# Altium footprint library Item_pcb.PcbLib: 282 footprints (part 18 of 18)
Each footprint in its own frame and in the unit in brackets; x right, y up, seen from the top. Pads: shape width x height; smd on the part's side, far side on the other; paste and mask are expansions set on the pad; w line width, h text height; cw(c..) or ccw(c..) is an arc to the next point about the centre after c.
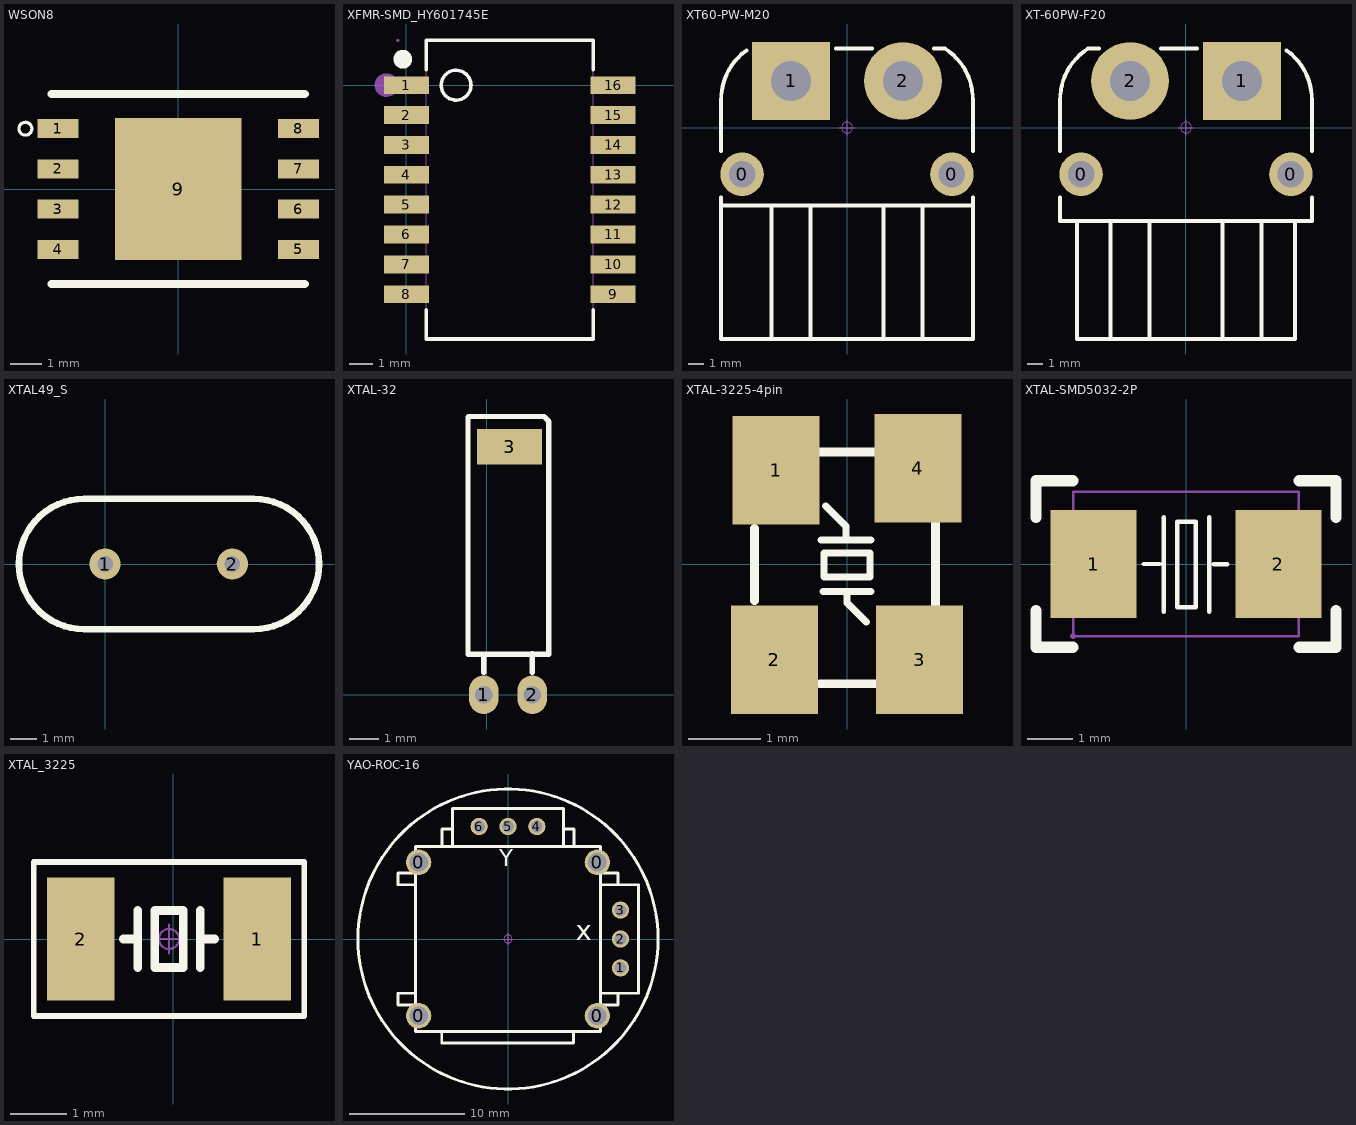
[diagram p17: the footprints below, top view; thin cyan lines are the x and y axes]

## WSON8 [mm]
pads (9):
  rect 1.3x0.6 smd: 1(-3.8,1.905) 2(-3.8,0.635) 3(-3.8,-0.635) 4(-3.8,-1.905) 5(3.8,-1.905) 6(3.8,-0.635) 7(3.8,0.635) 8(3.8,1.905)
  rect 4x4.5 smd: 9(0,0)
Top Overlay:
  circle w0.1: c-4.826,1.905 r0.203
  lines w0.254: -4,-3 4,-3 ; -4,3 4,3
3D body "User Library-WSON-8_6x8mm.STEP": height 0.81, standoff -0.07, extent -4.039,-3 3.961,3

## XFMR-SMD_HY601745E [mm]
pads (16):
  rect 1.905x0.76 smd: 1(0,0) 2(0,-1.27) 3(0,-2.54) 4(0,-3.81) 5(0,-5.08) 6(0,-6.35) 7(0,-7.62) 8(0,-8.89) 9(8.788,-8.89) 10(8.788,-7.62) 11(8.788,-6.35) 12(8.788,-5.08) 13(8.788,-3.81) 14(8.788,-2.54) 15(8.788,-1.27) 16(8.788,0)
Top Overlay:
  circle w0.15: c2.108,0 r0.635
  circle w0.4: c-0.156,1.105 r0.2
  lines w0.15: 0.839,-9.545 0.839,-10.795 7.949,-10.795 7.949,-9.545 ; 0.839,0.655 0.839,1.905 7.949,1.905 7.949,0.655
Mechanical 6:
  circle w0.5: c-0.856,0.005 r0.25
Mechanical 15:
  drawing of 37 lines, arcs and shapes, not listed
3D body "3D_PCB2_2024-03-27-HY_end.STEP": height 5.8, standoff 0.1, extent -0.356,-10.795 9.144,1.905

## XT60-PW-M20 [mm] "长：18.8mm， 宽：16mm，高：8.6mm"
pads (4):
  round 2.8 hole 1.7: 0(-6.75,-3) 0(6.75,-3)
  rect 5x5 hole 2.6: 1(-3.6,3)
  round 5 hole 2.6: 2(3.6,3)
Top Overlay:
  lines w0.254: -8.1,-4.5 -8.1,-5 ; -8.1,-1.5 -8.1,1.792 ; -8.1,1.738 cw(c-4.2,1.8) -6.476,4.967 ; -4.85,-13.6 -4.85,-5 ; -2.35,-13.6 -2.35,-5 ; -0.7,5.1 1.6,5.1 ; 2.35,-13.6 2.35,-5 ; 4.85,-13.6 4.85,-5 ; 5.6,5.1 6.294,5.1 ; 6.294,5.091 cw(c4.2,1.8) 8.1,1.738 8.1,-1.5 ; 8.1,-4.5 8.1,-5 ; -8.1,-5 -8.1,-13.6 8.1,-13.6 8.1,-5 ; -8.1,-5 8.1,-5
Mechanical 15:
  circle w0.05: c0,0 r0.35
  lines w0.05: -0.5,0 0.5,0 ; 0,-0.5 0,0.5
3D body "3D_xt60-PCB2_2021-12-22.step": height 9.7, standoff -1.4, extent -7.75,-14.97 7.75,5.029

## XT-60PW-F20 [mm]
pads (4):
  round 2.8 hole 1.7: 0(-6.75,-3) 0(6.75,-3)
  rect 5x5 hole 2.6: 1(3.6,3)
  round 5 hole 2.6: 2(-3.6,3)
Top Overlay:
  lines w0.254: -8.1,-4.5 -8.1,-6 8.1,-6 8.1,-4.5 ; -8.1,-1.5 -8.1,1.738 cw(c-4.2,1.8) -6.294,5.091 ; -7,-6 -7,-13.6 7,-13.6 7,-6 ; -6.294,5.1 -5.6,5.1 ; -4.85,-13.6 -4.85,-6 ; -2.35,-13.6 -2.35,-6 ; -1.6,5.1 0.7,5.1 ; 2.35,-13.6 2.35,-6 ; 4.85,-13.6 4.85,-6 ; 6.477,4.967 cw(c4.2,1.8) 8.1,1.738 ; 8.1,-1.5 8.1,1.792 ; 0,-6 ccw(c0,-6) 0,-6
Mechanical 15:
  circle w0.05: c0,0 r0.35
  lines w0.05: -0.5,0 0.5,0 ; 0,-0.5 0,0.5
3D body "TX60PW-F20.STEP": height 8.65, standoff -2.35, extent -8,-13.6 8,5.02

## XTAL49_S [mm]
pads (2):
  round 1.2 hole 0.6: 1(0,0) 2(4.88,0)
Top Overlay:
  lines w0.254: -3.3,0 ccw(c-0.8,0) -0.8,-2.5 5.7,-2.5 ccw(c5.7,0) 8.2,0 ccw(c5.7,0) 5.7,2.5 -0.8,2.5 ccw(c-0.8,0) -3.3,0
Mechanical 13:
  lines w0.025: -3.3,0 cw(c-0.8,0) -0.8,2.5 5.7,2.5 cw(c5.7,0) 8.2,0 cw(c5.7,0) 5.7,-2.5 -0.8,-2.5 cw(c-0.8,0) -3.3,0
3D body "SW3dPS-HP49US.STEP": height 4, standoff -3.5, extent -3.225,-2.32 8.125,2.33

## XTAL-32 [mm]
pads (3):
  oval 1x1.3 hole 0.6: 1(-0.1,0) 2(1.54,0)
  rect 2.2x1.2 smd: 3(0.775,8.382)
Top Overlay:
  lines w0.178: -0.1,0.762 -0.1,1.37 ; 1.54,0.762 1.54,1.386 ; -0.63,1.37 2.1,1.37 2.1,8.77 2.1,9.23 1.932,9.398 -0.608,9.398 -0.63,9.376 -0.63,8.77 -0.63,1.37
3D body "XTAL D2X6.STEP": height 2, standoff -1, extent -0.289,-0.229 1.711,7.471

## XTAL-3225-4pin [mm]
pads (4):
  rect 1.2x1.5 smd: 1(-0.978,1.295) 2(-1.003,-1.321) 3(1.003,-1.321) 4(0.978,1.321)
Top Overlay:
  lines w0.1: -0.356,0.33 0.33,0.33 ; -0.33,-0.381 0.33,-0.381 ; -0.292,0.8 -0.013,0.521 -0.013,0.33 ; 0,-0.381 0,-0.533 0.267,-0.8 ; -0.318,-0.178 -0.318,0.152 0.318,0.152 0.318,-0.178 -0.318,-0.178
  lines w0.12: -1.278,-0.505 -1.278,0.495 ; -0.378,-1.655 0.422,-1.655 ; -0.378,1.545 0.422,1.545 ; 1.222,-0.605 1.222,0.595
3D body "XTAL-3225.STEP": height 0.8, standoff 0, extent -1.268,-1.651 1.232,1.549

## XTAL-SMD5032-2P [mil]
pads (2):
  rect 74.8x94.5 smd mask+2: 1(-80.7,0) 2(80.7,0)
Top Overlay:
  lines w3.9: -37,0 -23,0 ; -19.25,-41.75 -19.25,40.95 ; 20.15,-41.75 20.15,40.95 ; 24.3,-0.4 36.1,-0.4 ; -7.45,-37.75 8.35,-37.75 8.35,37.05 -7.45,37.05 -7.45,-37.75
  lines w10: -130.9,-40.78 -130.9,-72.8 -98.88,-72.8 ; -130.9,40.78 -130.9,72.8 -98.88,72.8 ; 98.88,-72.8 130.9,-72.8 130.9,-40.78 ; 98.88,72.8 130.9,72.8 130.9,40.78
Mechanical 15:
  region: -47.2,39.4 -47.2,-39.4 -98.4,-39.4 -98.4,39.4
  region: 98.4,39.4 98.4,-39.4 47.2,-39.4 47.2,39.4
  region: -96,-63 -96,-62.01 -97.41,-60.6 -99.39,-60.6 -100.8,-62.01 -100.8,-63 -100.8,-63.99 -99.39,-65.4 -97.41,-65.4 -96,-63.99
  lines w2: -98.4,-63 98.4,-63 98.4,63 -98.4,63 -98.4,-63
3D body "XTAL-Crystal SMD 5X3.2.STEP": height 39.37, standoff 0, extent -97.98,-62.99 98.88,62.99

## XTAL_3225 [mm]
pads (2):
  rect 1.2x2.2 smd: 1(1.498,0) 2(-1.65,0)
Top Overlay:
  lines w0.1: -2.489,-1.372 -2.489,1.372 2.337,1.372 2.337,-1.372 -2.489,-1.372
  lines w0.152: -0.889,0 -0.635,0 ; -0.635,-0.508 -0.635,0.508 ; 0.483,-0.508 0.483,0.508 ; 0.483,0 0.737,0 ; -0.33,-0.508 -0.33,0.508 0.178,0.508 0.178,-0.508 -0.33,-0.508
Mechanical 15:
  circle w0.04: c-0.076,0 r0.18
  lines w0.04: -0.33,0 0.178,0 ; -0.076,-0.254 -0.076,0.254
3D body "OSC 3225-4.STEP": height 0.7, standoff -0.02, extent -1.676,-1.25 1.524,1.25

## YAO-ROC-16 [mm] "摇杆电位器，长16mm，宽16mm，高12.2mm"
pads (10):
  round 2.2 hole 1.6: 0(-7.75,-6.65) 0(-7.75,6.65) 0(7.75,-6.65) 0(7.75,6.65)
  round 1.5 hole 1: 1(9.75,-2.5) 2(9.75,0) 3(9.75,2.5) 4(2.5,9.75) 5(0,9.75) 6(-2.5,9.75)
Top Overlay:
  circle w0.254: c0,0 r13
  lines w0.254: -8,-5.715 -9.525,-5.715 -9.525,-4.699 -8,-4.699 ; -8,4.699 -9.525,4.699 -9.525,5.715 -8,5.715 ; -5.741,-8.028 -5.741,-9.017 5.689,-9.017 5.689,-8.027 5.663,-8.053 ; -5.715,8 -5.715,9.525 -4.8,9.525 ; -4.8,8 -4.8,11.3 4.8,11.3 4.8,8 ; 4.8,9.144 4.8,8 ; 4.8,9.525 5.715,9.525 5.715,8 ; 4.826,8.026 4.8,8 ; 8,-5.715 9.525,-5.715 9.525,-4.699 ; 8,-4.699 9.525,-4.699 ; 8,4.699 9.525,4.699 ; 8,5.715 9.525,5.715 9.525,4.699 ; 9.525,-4.699 11.3,-4.699 11.301,-2.425 ; 9.525,4.699 11.303,4.699 11.302,2.324 11.301,-2.425 ; 11.301,-2.425 11.301,-2.425 ; -8,-8 8,-8 8,8 -8,8 -8,-8
  text "x" at 5.867,-0.737 h3
  text "Y" at -0.762,5.842 h2.5
Mechanical 15:
  circle w0.05: c0,0 r0.35
  lines w0.05: -0.5,0 0.5,0 ; 0,-0.5 0,0.5
3D body "ROC16.STEP": height 29.36, standoff -3.65, extent -12.5,-12.5 12.5,12.5